# Altium footprint library Miscellaneous.PcbLib: 139 footprints (part 3 of 9)
Each footprint in its own frame and in the unit in brackets; x right, y up, seen from the top. Pads: shape width x height; smd on the part's side, far side on the other; paste and mask are expansions set on the pad; w line width, h text height; cw(c..) or ccw(c..) is an arc to the next point about the centre after c.
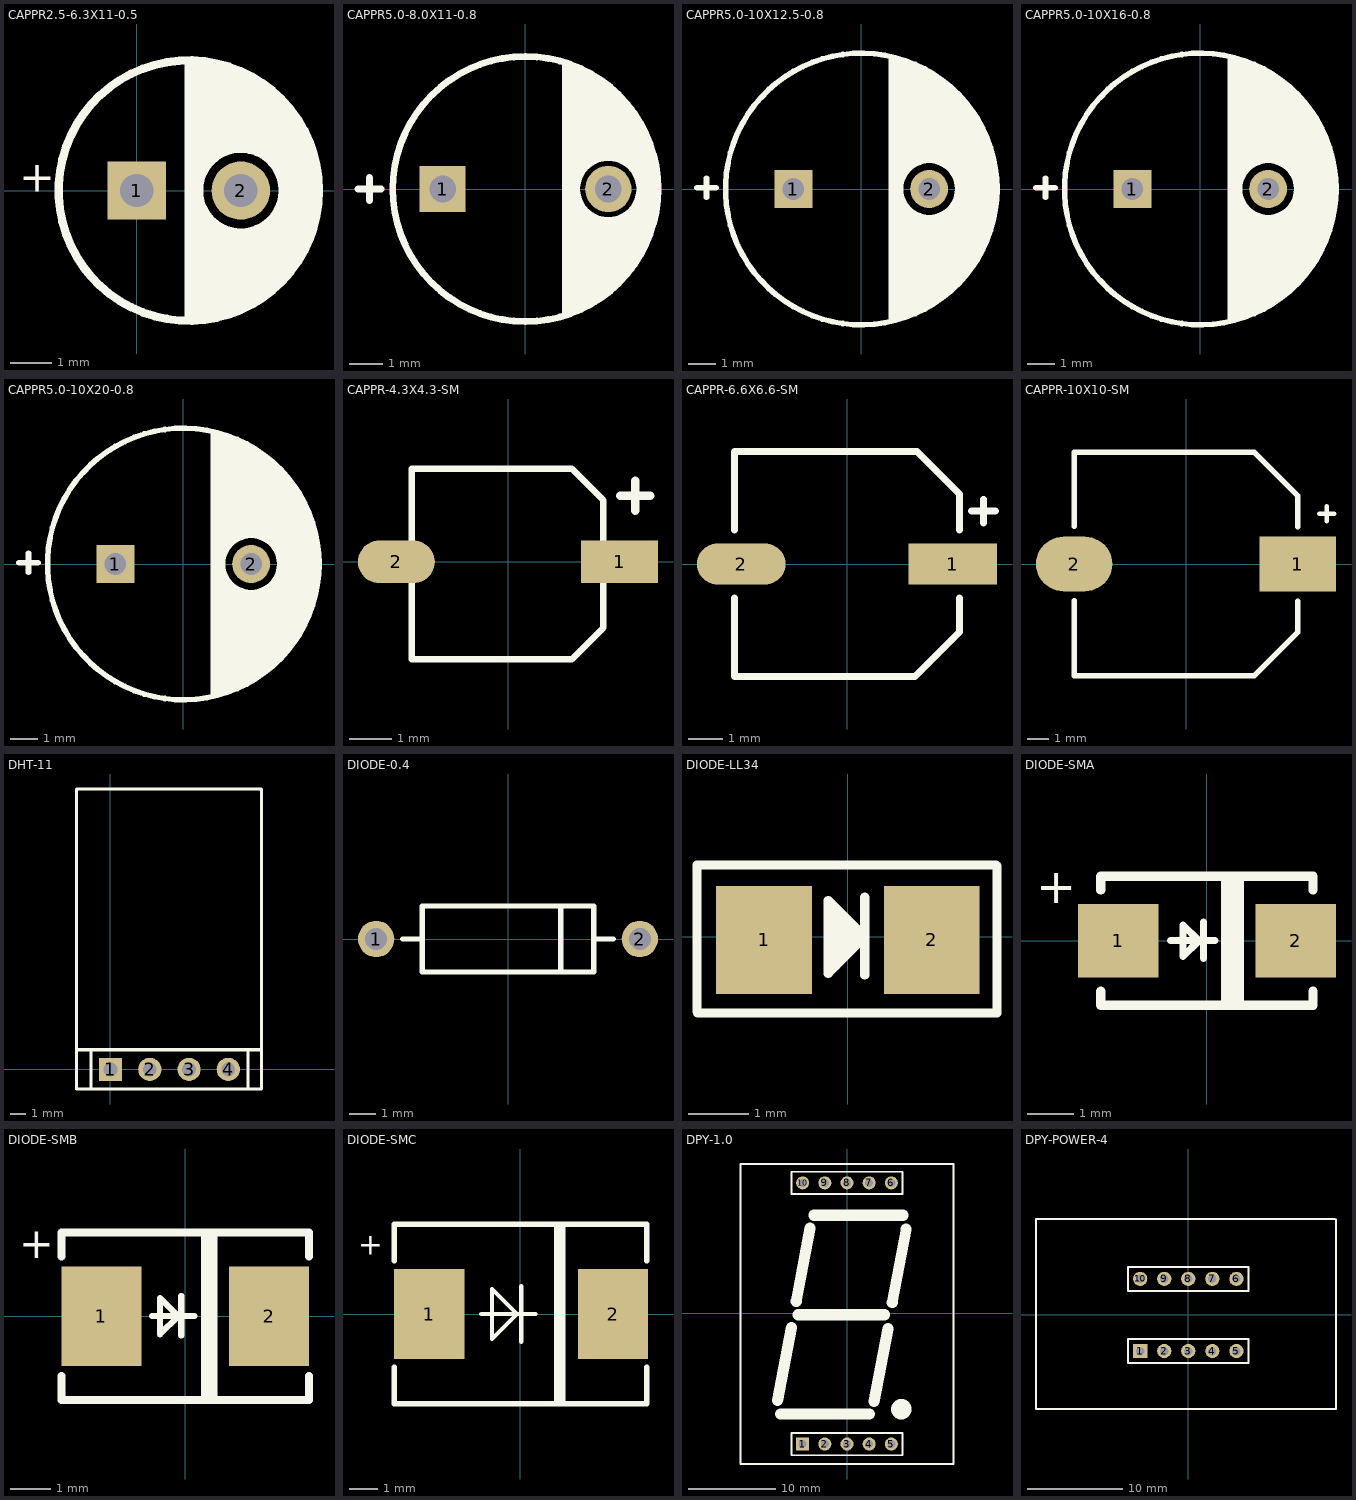
[diagram p2: the footprints below, top view; thin cyan lines are the x and y axes]

## CAPPR2.5-6.3X11-0.5 [mil]
pads (2):
  rect 56x56 hole 32: 1(0,0)
  round 56 hole 32: 2(100,0)
Top Overlay:
  circle w10: c100,0 r41.23
  circle w8: c50,0 r125
  region: 52,128 54,126 54,54 51,51 51,2 55,-2 60,3 60,21 78,39 118,39 142,15 142,-14 115,-41 87,-41 63,-17 63,-11 56,-4 55,-5 51,-5 51,-119 50,-120 55,-125 77,-125 88,-114 88,-118 97,-118 107,-108 114,-108 156,-66 156,-59 165,-50 165,-39 173,-31 173,13 174,14 171,17 171,38 162,47 162,58 147,73 147,75 112,110 100,110 96,114
  lines w8: 50,-120 50,120
  text "+" at -113,-1 h30
3D body "User Library-Cap-EL(6_3x11-2_5).step": height 433.15, standoff -125.98, extent -76.01,-120.98 172.1,126.99

## CAPPR5.0-8.0X11-0.8 [mm]
pads (2):
  rect 1.4x1.4 hole 0.8: 1(-2.5,0)
  round 1.4 hole 0.8: 2(2.5,0)
Top Overlay:
  circle w0.5: c2.5,0 r1.1
  circle w0.203: c0,0 r4
  lines w0.203: -5.05,0 -4.7,0 ; -4.7,-0.35 -4.7,0 ; -4.7,0.35 -4.7,0 ; -4.35,0 -4.7,0 ; 1.2,-3.8 1.2,3.8 ; 1.3,-3.6 1.7,-3.6 ; 1.4,-3.6 1.4,3.7 ; 1.4,-3.4 2.1,-3.4 2.5,-3 2.5,-1.3 ; 1.6,-3.4 1.6,-0.8 ; 1.6,0.8 1.6,3.6 ; 1.7,-3.4 1.7,-0.9 ; 1.8,-3.4 1.8,-1 ; 1.8,1 1.8,3.5 ; 2,-3.3 2,-1.1 ; 2,1.1 2,3.4 ; 2.1,-3.2 2.1,-1.2 ; 2.2,1.2 2.2,3.3 ; 2.3,-3.2 2.3,-1.2 ; 2.4,3.1 2.4,1.2 2.6,1.4 2.6,3 ; 2.597,1.397 2.8,1.397 2.6,1.597 2.6,1.651 ; 2.7,-2.9 2.7,-1.2 ; 2.8,-2.8 2.8,-1.2 ; 2.8,1.2 2.8,2.7 ; 3,-2.6 3,-1.1 ; 3,1 3,2.6 ; 3.2,-2.4 3.2,-1 ; 3.2,0.9 3.2,2.4 ; 3.4,-1.9 3.4,-0.8 ; 3.4,0.7 3.4,2 ; 3.6,-1.7 3.6,1.7 ; 3.7,-1.38 3.7,-0.87 3.835,-0.735 3.6,-0.735 3.9,-0.435 3.9,0.8 ; 3.7,-1.1 3.7,1.2 3.7,1 3.9,0.8 ; 3.9,-0.8 3.9,0.8
  lines w0.254: 2.6,2.8 2.7,2.8 2.3,3.2 2.3,3.1 3.3,2.1 ; 3.4,-2 3.4,-1.6
3D body "RC.3-.0.STEP": height 12.5, standoff -2, extent -4,-4 4,4

## CAPPR5.0-10X12.5-0.8 [mm]
pads (2):
  rect 1.4x1.4 hole 0.8: 1(-2.5,0)
  round 1.4 hole 0.8: 2(2.5,0)
Top Overlay:
  circle w0.5: c2.5,0 r1.2
  circle w0.203: c0,0 r5
  rectangle: 1,-4.8 1.4,4.8
  rectangle: 1.3,-4.7 1.5,4.8
  rectangle: 1.45,1 2.8,4.2
  rectangle: 2.7,1 3.5,3.6
  rectangle: 3.5,-3.2 3.8,3.3
  rectangle: 1.5,-3.5 3.5,-1
  rectangle: 1.5,-4.2 2.8,-3.3
  rectangle: 3.7,-2.6 4.2,2.8
  rectangle: 4.1,-1.8 4.6,2.2
  rectangle: 4.5,-1.1 4.9,1.4
  lines w0.203: -6.05,0.05 -5.7,0.05 ; -5.7,-0.3 -5.7,0.05 ; -5.7,0.4 -5.7,0.05 ; -5.35,0.05 -5.7,0.05
  lines w1: 1.514,-4.238 ccw(c0,0) 1.569,4.217
3D body "User Library-CAP_Electrolytic_10X14_.step": height 14.1, standoff -4.72, extent -5,-5.055 5,4.945

## CAPPR5.0-10X16-0.8 [mm]
pads (2):
  rect 1.4x1.4 hole 0.8: 1(-2.5,0)
  round 1.4 hole 0.8: 2(2.5,0)
Top Overlay:
  circle w0.5: c2.5,0 r1.2
  circle w0.203: c0,0 r5
  rectangle: 1,-4.8 1.4,4.8
  rectangle: 1.3,-4.7 1.5,4.8
  rectangle: 1.45,1 2.8,4.2
  rectangle: 2.7,1 3.5,3.6
  rectangle: 3.5,-3.2 3.8,3.3
  rectangle: 1.5,-3.5 3.5,-1
  rectangle: 1.5,-4.2 2.8,-3.3
  rectangle: 3.7,-2.6 4.2,2.8
  rectangle: 4.1,-1.8 4.6,2.2
  rectangle: 4.5,-1.1 4.9,1.4
  lines w0.203: -6.05,0.05 -5.7,0.05 ; -5.7,-0.3 -5.7,0.05 ; -5.7,0.4 -5.7,0.05 ; -5.35,0.05 -5.7,0.05
  lines w1: 1.514,-4.238 ccw(c0,0) 1.569,4.217
3D body "RC.3-.1.STEP": height 15.68, standoff -2.45, extent -5.1,-5.1 4.9,4.9

## CAPPR5.0-10X20-0.8 [mm]
pads (2):
  rect 1.4x1.4 hole 0.8: 1(-2.5,0)
  round 1.4 hole 0.8: 2(2.5,0)
Top Overlay:
  circle w0.5: c2.5,0 r1.2
  circle w0.203: c0,0 r5
  rectangle: 1,-4.8 1.4,4.8
  rectangle: 1.3,-4.7 1.5,4.8
  rectangle: 1.45,1 2.8,4.2
  rectangle: 2.7,1 3.5,3.6
  rectangle: 3.5,-3.2 3.8,3.3
  rectangle: 1.5,-3.5 3.5,-1
  rectangle: 1.5,-4.2 2.8,-3.3
  rectangle: 3.7,-2.6 4.2,2.8
  rectangle: 4.1,-1.8 4.6,2.2
  rectangle: 4.5,-1.1 4.9,1.4
  lines w0.203: -6.05,0.05 -5.7,0.05 ; -5.7,-0.3 -5.7,0.05 ; -5.7,0.4 -5.7,0.05 ; -5.35,0.05 -5.7,0.05
  lines w1: 1.514,-4.238 ccw(c0,0) 1.569,4.217
3D body "User Library-CAP_Electrolytic_10X20.step": height 20.1, standoff -4.72, extent -4.996,-5 5.004,5

## CAPPR-4.3X4.3-SM [mm]
pads (2):
  rect 1.8x1 smd: 1(2.616,0)
  oval 1.8x1 smd: 2(-2.616,0)
Top Overlay:
  lines w0.152: -2.261,-2.286 -2.261,2.184 1.499,2.184 2.235,1.448 2.235,-1.549 1.499,-2.286 -2.261,-2.286
  lines w0.203: 2.634,1.55 2.984,1.55 ; 2.984,1.2 2.984,1.55 ; 2.984,1.9 2.984,1.55 ; 3.334,1.55 2.984,1.55
3D body "User Library-cap-elec-430x430h390.step": height 3.9, standoff 0, extent -2.675,-2.201 2.625,2.099

## CAPPR-6.6X6.6-SM [mm]
pads (2):
  rect 2.6x1.2 smd: 1(3.1,0)
  oval 2.6x1.2 smd: 2(-3.1,0)
Top Overlay:
  lines w0.203: -3.3,-1 -3.3,-3.3 2,-3.3 3.3,-2 3.3,-1 ; -3.3,1 -3.3,3.3 2.05,3.3 3.3,2.05 3.3,1 ; 3.65,1.55 4,1.55 ; 4,1.2 4,1.55 ; 4,1.9 4,1.55 ; 4.35,1.55 4,1.55
3D body "CAP 4040.STEP": height 8, standoff 0, extent -3.656,-3.05 3.456,3.1

## CAPPR-10X10-SM [mm]
pads (2):
  rect 3.5x2.5 smd: 1(5.125,0)
  oval 3.5x2.5 smd: 2(-5.125,0)
Top Overlay:
  lines w0.203: 6.1,2.3 6.45,2.3 ; 6.45,1.95 6.45,2.3 ; 6.45,2.65 6.45,2.3 ; 6.8,2.3 6.45,2.3
  lines w0.254: -5.125,-1.675 -5.125,-5.125 3.125,-5.125 5.125,-3.125 5.125,-1.7 ; -5.125,1.725 -5.125,5.125 3.125,5.125 5.125,3.125 5.125,1.7
3D body "CAP 4040.STEP": height 11, standoff 0, extent -5.918,-5.105 5.936,5.145

## DHT-11 [mm]
pads (4):
  rect 1.5x1.5 hole 0.9: 1(0,0)
  round 1.5 hole 0.9: 2(2.54,0) 3(5.08,0) 4(7.62,0)
Top Overlay:
  lines w0.203: -2.134,1.27 -1.27,1.27 ; 9.754,1.245 9.728,1.27 8.89,1.27 ; -1.27,-1.27 -1.27,1.27 ; -1.27,-1.27 8.89,-1.27 ; -1.27,-1.27 -2.184,-1.27 -2.21,-1.245 -2.21,18.136 9.779,18.136 9.779,-1.27 8.89,-1.27 ; -1.27,1.27 8.89,1.27 ; 8.89,-1.27 8.89,1.27
3D body "User Library-DHT11-right.step": height 5.5, standoff -2.6, extent -2.215,-0.336 9.785,18.164

## DIODE-0.4 [mm] "Diode, Thru-Hole; 2 Leads; 0.4 in Pin Spacing"
height 2.54
pads (2):
  round 1.4 hole 0.85: 1(-5.08,0) 2(5.08,0)
Top Overlay:
  lines w0.2: -4.064,0 -3.302,0 ; 2.032,-1.27 2.032,1.27 ; 3.302,0 4.064,0 ; -3.302,-1.27 3.302,-1.27 3.302,1.27 -3.302,1.27 -3.302,-1.27
3D body "User Library-DO-41-2.step": height 2.72, standoff -2.6, extent -5.563,-1.323 5.461,1.397

## DIODE-LL34 [mm]
height 1.3
pads (2):
  rect 1.6x1.8 smd: 1(-1.4,-0.051) 2(1.4,-0.051)
Top Overlay:
  lines w0.152: -0.102,-0.178 -0.102,-0.203 -0.33,-0.432 -0.33,-0.61 ; -0.076,-0.076 -0.076,-0.178 0.051,-0.051 0.051,-0.025 ; 0.279,-0.635 0.279,0.66 0.279,0 ; -0.33,-0.61 -0.203,-0.483 -0.203,0.051 -0.279,-0.025 ; -0.33,-0.61 0.279,0 ; -0.33,-0.61 -0.33,0.61 ; -0.33,0.61 -0.33,0.559 0.254,-0.025 ; -0.33,0.61 0.279,0 ; -0.279,-0.025 -0.279,0.356 -0.203,0.432 -0.203,0.229 0.051,-0.025 ; -0.279,-0.025 0.254,-0.025 ; 0.051,-0.025 0.254,-0.025 ; -2.521,-1.249 -2.521,1.198 2.474,1.198 2.489,1.183 2.489,-1.27 -2.509,-1.27 -2.509,-1.249 -2.521,-1.249
3D body "User Library-Diode MELF.step": height 1.51, standoff 0.01, extent -1.75,-0.775 1.75,0.724

## DIODE-SMA [mm] "DO-214AC"
pads (2):
  rect 1.75x1.6 smd: 1(-1.925,0) 2(1.925,0)
Top Overlay:
  rectangle: 0.3,-1.5 0.806,1.5
  lines w0.152: -0.787,0 0.178,0 ; -0.076,-0.381 -0.076,0.406 ; -0.521,-0.343 -0.521,0.343 -0.178,0 -0.521,-0.343
  lines w0.203: -2.3,-1.1 -2.3,-1.4 2.3,-1.4 2.3,-1.1 ; -2.3,1.1 -2.3,1.4 2.3,1.4 2.3,1.1
  text "+" at -3.708,0.813 h0.76
3D body "SMA.STEP": height 2.15, standoff 0, extent -2.6,-1.325 2.6,1.325

## DIODE-SMB [mm]
pads (2):
  rect 2x2.5 smd: 1(-2.1,0) 2(2.1,0)
Top Overlay:
  rectangle: 0.4,-2.1 0.806,2.1
  lines w0.152: -0.838,0 0.229,0 ; -0.102,-0.483 -0.102,0.508 ; -0.635,-0.457 -0.178,0 -0.635,0.457 -0.635,-0.457
  lines w0.203: -3.1,-1.5 -3.1,-2.1 3.1,-2.1 3.1,-1.5 ; -3.1,1.5 -3.1,2.1 3.1,2.1 3.1,1.5
  text "+" at -4.166,1.448 h0.76
3D body "SMB.STEP": height 2.4, standoff 0, extent -2.794,-1.905 2.806,1.895

## DIODE-SMC [mm]
pads (2):
  rect 2.5x3.2 smd: 1(-3.25,0) 2(3.302,0)
Top Overlay:
  rectangle: 1.2,-3.2 1.606,3.2
  lines w0.152: -1.397,0 0.533,0 ; 0.025,-0.991 0.025,0.991 ; -1.016,-0.889 -0.127,0 -1.016,0.889 -1.016,-0.889
  lines w0.203: -4.5,-1.9 -4.5,-3.2 4.5,-3.2 4.5,-1.9 ; -4.5,1.9 -4.5,3.2 4.5,3.2 4.5,1.9
  text "+" at -5.791,2.108 h0.76
3D body "SMC.STEP": height 2.8, standoff 0, extent -3.85,-3.15 3.748,3.07

## DPY-1.0 [mm]
pads (10):
  rect 1.5x1.5 hole 0.9: 1(-5.08,-14.961)
  round 1.5 hole 0.9: 2(-2.54,-14.961) 3(0,-14.961) 4(2.54,-14.961) 5(5.08,-14.961) 6(5.08,14.961) 7(2.54,14.961) 8(0,14.961) 9(-2.54,14.961) 10(-5.08,14.961)
Top Overlay:
  circle w2.032: c6.223,-10.973 r0.15
  lines w0.2: -6.35,-16.231 6.35,-16.231 6.35,-13.691 -6.35,-13.691 -6.35,-16.231 ; -6.35,13.691 -6.35,16.231 6.35,16.231 6.35,13.691 -6.35,13.691
  lines w0.203: -12.192,-17.247 -12.192,17.12 12.192,17.12 12.192,-17.247 -12.192,-17.247
  lines w1.27: -7.976,-9.982 -6.375,-1.6 ; -7.62,-11.532 2.591,-11.532 ; -5.817,1.397 -4.216,9.779 ; -5.588,-0.152 4.318,-0.152 ; -3.785,11.252 6.426,11.252 ; 3.099,-10.109 4.699,-1.727 ; 5.182,1.27 6.782,9.652
3D body "shu.stp": height 15.14, standoff 0.03, extent -11.986,-17.051 12.014,16.949

## DPY-POWER-4 [mm]
pads (10):
  rect 1.5x1.5 hole 0.9: 1(-5.08,-3.81)
  round 1.5 hole 0.9: 2(-2.54,-3.81) 3(0,-3.81) 4(2.54,-3.81) 5(5.08,-3.81) 6(5.08,3.81) 7(2.54,3.81) 8(0,3.81) 9(-2.54,3.81) 10(-5.08,3.81)
Top Overlay:
  lines w0.2: -6.35,-5.08 6.35,-5.08 6.35,-2.54 -6.35,-2.54 -6.35,-5.08 ; -6.35,2.54 -6.35,5.08 6.35,5.08 6.35,2.54 -6.35,2.54
  lines w0.203: 15.498,10.135 -16.078,10.135 -16.078,-9.881 -16.027,-9.931 15.574,-9.931 ; 15.596,-9.931 15.596,10.084